# Altium footprint library SMDLibrary.PcbLib: 306 footprints (part 13 of 20)
Each footprint in its own frame and in the unit in brackets; x right, y up, seen from the top. Pads: shape width x height; smd on the part's side, far side on the other; paste and mask are expansions set on the pad; w line width, h text height; cw(c..) or ccw(c..) is an arc to the next point about the centre after c.
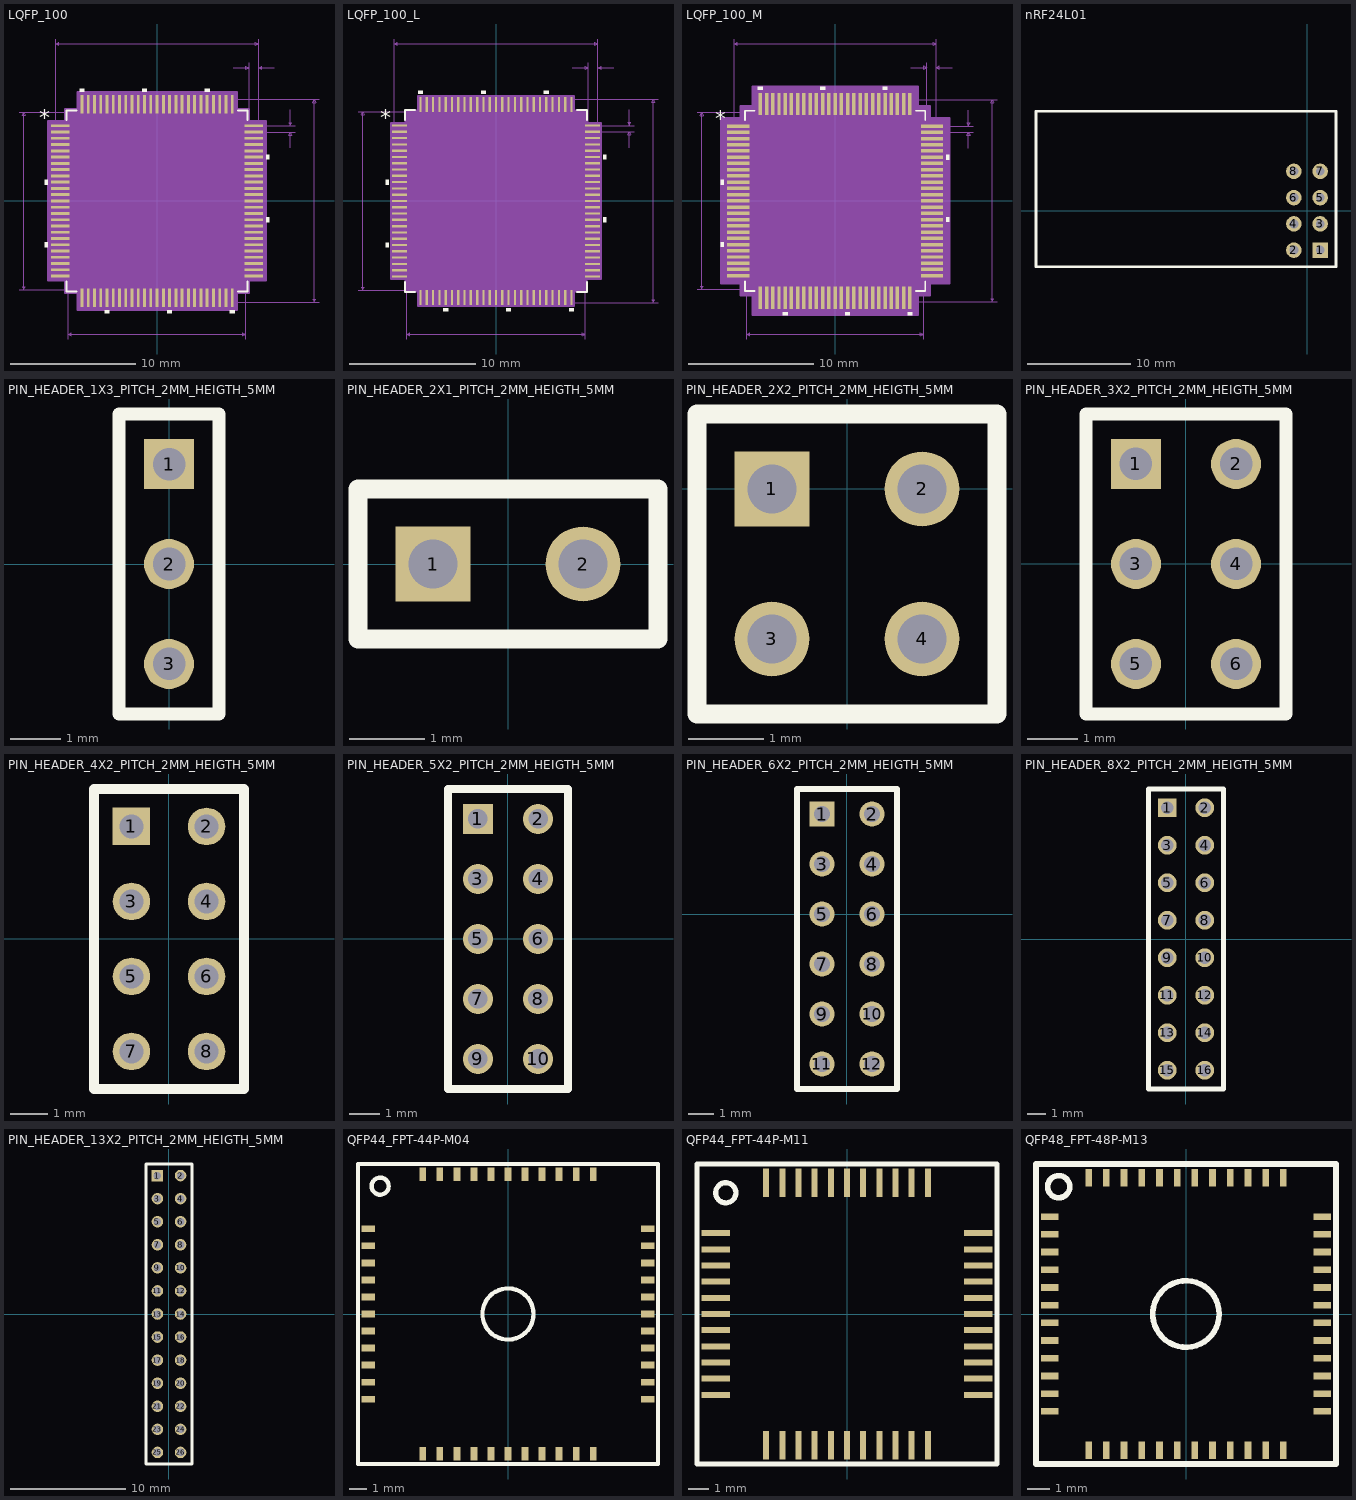
[diagram p12: the footprints below, top view; thin cyan lines are the x and y axes]

## LQFP_100 [mil]
pads (100):
  rect 58x9 smd paste+0 mask+0: 1(-304,236.22) 2(-304,216.54) 3(-304,196.85) 4(-304,177.17) 5(-304,157.48) 6(-304,137.8) 7(-304,118.11) 8(-304,98.43) 9(-304,78.74) 10(-304,59.06) 11(-304,39.37) 12(-304,19.69) 13(-304,0) 14(-304,-19.68) 15(-304,-39.37) 16(-304,-59.06) 17(-304,-78.74) 18(-304,-98.43) 19(-304,-118.11) 20(-304,-137.8) 21(-304,-157.48) 22(-304,-177.17) 23(-304,-196.85) 24(-304,-216.54) 25(-304,-236.22) 51(304,-236.22) 52(304,-216.54) 53(304,-196.85) 54(304,-177.17) 55(304,-157.48) 56(304,-137.8) 57(304,-118.11) 58(304,-98.43) 59(304,-78.74) 60(304,-59.06) 61(304,-39.37) 62(304,-19.68) 63(304,0) 64(304,19.68) 65(304,39.37) 66(304,59.06) 67(304,78.74) 68(304,98.43) 69(304,118.11) 70(304,137.8) 71(304,157.48) 72(304,177.17) 73(304,196.85) 74(304,216.54) 75(304,236.22)
  rect 9x58 smd paste+0 mask+0: 26(-236.22,-304) 27(-216.54,-304) 28(-196.85,-304) 29(-177.17,-304) 30(-157.48,-304) 31(-137.8,-304) 32(-118.11,-304) 33(-98.43,-304) 34(-78.74,-304) 35(-59.06,-304) 36(-39.37,-304) 37(-19.68,-304) 38(0,-304) 39(19.68,-304) 40(39.37,-304) 41(59.06,-304) 42(78.74,-304) 43(98.43,-304) 44(118.11,-304) 45(137.8,-304) 46(157.48,-304) 47(177.17,-304) 48(196.85,-304) 49(216.54,-304) 50(236.22,-304) 76(236.22,304) 77(216.54,304) 78(196.85,304) 79(177.17,304) 80(157.48,304) 81(137.8,304) 82(118.11,304) 83(98.43,304) 84(78.74,304) 85(59.06,304) 86(39.37,304) 87(19.68,304) 88(0,304) 89(-19.68,304) 90(-39.37,304) 91(-59.06,304) 92(-78.74,304) 93(-98.43,304) 94(-118.11,304) 95(-137.8,304) 96(-157.48,304) 97(-177.17,304) 98(-196.85,304) 99(-216.54,304) 100(-236.22,304)
Top Overlay:
  region: -228.72,343 -243.72,343 -243.72,353 -228.72,353
  region: -31.87,343 -46.87,343 -46.87,353 -31.87,353
  region: 164.98,343 149.98,343 149.98,353 164.98,353
  region: 343,145.3 353,145.3 353,130.3 343,130.3
  region: 343,-51.56 353,-51.56 353,-66.56 343,-66.56
  region: 243.72,-343 228.72,-343 228.72,-353 243.72,-353
  region: 46.87,-343 31.87,-343 31.87,-353 46.87,-353
  region: -149.98,-343 -164.98,-343 -164.98,-353 -149.98,-353
  region: -343,-130.3 -353,-130.3 -353,-145.3 -343,-145.3
  region: -343,66.56 -353,66.56 -353,51.56 -343,51.56
  lines w6: -284.5,-253.82 -284.5,-284.5 -253.82,-284.5 ; -284.5,253.82 -284.5,284.5 -253.82,284.5 ; 253.82,-284.5 284.5,-284.5 284.5,-253.82 ; 253.82,284.5 284.5,284.5 284.5,253.82
  text "*" at -370.5,236.06 h50
Mechanical 7:
  lines w1: -434,-279.5 -236.22,-279.5 ; -434,279.5 -236.22,279.5 ; -319,236.22 -319,509 ; -279.5,-434 -279.5,-236.22 ; 236.22,-319 509,-319 ; 236.22,319 509,319 ; 239,419 289,419 ; 279.5,-434 279.5,-236.22 ; 289,236.22 289,434 ; 304,216.54 434,216.54 ; 304,236.22 434,236.22 ; 319,434 319,236.22 319,509 ; 369,419 319,419 ; 419,166.54 419,216.54 ; 419,286.22 419,236.22 ; -419,-279.5 -414,-269.5 -424,-269.5 -419,-279.5 ; -419,-279.5 -419,279.5 ; -419,279.5 -414,269.5 -424,269.5 -419,279.5 ; -319,494 -309,489 -309,499 -319,494 ; -319,494 319,494 ; -279.5,-419 -269.5,-424 -269.5,-414 -279.5,-419 ; -279.5,-419 279.5,-419 ; 279.5,-419 269.5,-424 269.5,-414 279.5,-419 ; 289,419 279,414 279,424 289,419 ; 319,419 329,414 329,424 319,419 ; 319,494 309,489 309,499 319,494 ; 419,216.54 424,206.54 414,206.54 419,216.54 ; 419,236.22 424,246.22 414,246.22 419,236.22 ; 494,-319 499,-309 489,-309 494,-319 ; 494,-319 494,319 ; 494,319 499,309 489,309 494,319
  text "0.638in/16.205mm" at 514,-12.5 h25
  text "0.559in/14.199mm" at -639,-12.5 h25
  text "0.559in/14.199mm" at -100,-464 h25
  text "0.638in/16.205mm" at -100,514 h25
  text "0.03in/0.762mm" at 216.5,439 h25
  text "0.02in/0.5mm" at 439,213.88 h25
  text "Alt 2 Padstyle: OX90Y60D30P" at -337.5,-869 h50
  text "Alt 1 Padstyle: OX60Y90D30P" at -337.5,-809 h50
  text "Default Vert Padstyle: RX9Y58D0T" at -400,-629 h50
  text "Default Horiz Padstyle: RX9Y58D0T" at -412.5,-569 h50
Mechanical 13:
  drawing of 405 lines, arcs and shapes, not listed
  text "*" at -277,221.06 h50
Mechanical 15:
  region: -250.72,-289.5 -289.5,-289.5 -289.5,-250.72 -343,-250.72 -343,250.72 -289.5,250.72 -289.5,289.5 -250.72,289.5 -250.72,343 250.72,343 250.72,289.5 289.5,289.5 289.5,250.72 343,250.72 343,-250.72 289.5,-250.72 289.5,-289.5 250.72,-289.5 250.72,-343 -250.72,-343
  lines w6: -343,-250.72 -343,250.72 -289.5,250.72 -289.5,289.5 -250.72,289.5 -250.72,343 250.72,343 250.72,289.5 289.5,289.5 289.5,250.72 343,250.72 343,-250.72 289.5,-250.72 289.5,-289.5 250.72,-289.5 250.72,-343 -250.72,-343 -250.72,-289.5 -289.5,-289.5 -289.5,-250.72 -343,-250.72
3D body "LQFP-100.step": height 63.11, standoff 0, extent -319.01,-319.01 319.02,319.02
3D body: height 10, standoff 0, extent 0,0 10,10

## LQFP_100_L [mil]
pads (100):
  rect 46x7 smd paste+0 mask+0: 1(-302,236.22) 2(-302,216.54) 3(-302,196.85) 4(-302,177.17) 5(-302,157.48) 6(-302,137.8) 7(-302,118.11) 8(-302,98.43) 9(-302,78.74) 10(-302,59.06) 11(-302,39.37) 12(-302,19.69) 13(-302,0) 14(-302,-19.68) 15(-302,-39.37) 16(-302,-59.06) 17(-302,-78.74) 18(-302,-98.43) 19(-302,-118.11) 20(-302,-137.8) 21(-302,-157.48) 22(-302,-177.17) 23(-302,-196.85) 24(-302,-216.54) 25(-302,-236.22) 51(302,-236.22) 52(302,-216.54) 53(302,-196.85) 54(302,-177.17) 55(302,-157.48) 56(302,-137.8) 57(302,-118.11) 58(302,-98.43) 59(302,-78.74) 60(302,-59.06) 61(302,-39.37) 62(302,-19.68) 63(302,0) 64(302,19.68) 65(302,39.37) 66(302,59.06) 67(302,78.74) 68(302,98.43) 69(302,118.11) 70(302,137.8) 71(302,157.48) 72(302,177.17) 73(302,196.85) 74(302,216.54) 75(302,236.22)
  rect 7x46 smd paste+0 mask+0: 26(-236.22,-302) 27(-216.54,-302) 28(-196.85,-302) 29(-177.17,-302) 30(-157.48,-302) 31(-137.8,-302) 32(-118.11,-302) 33(-98.43,-302) 34(-78.74,-302) 35(-59.06,-302) 36(-39.37,-302) 37(-19.68,-302) 38(0,-302) 39(19.68,-302) 40(39.37,-302) 41(59.06,-302) 42(78.74,-302) 43(98.43,-302) 44(118.11,-302) 45(137.8,-302) 46(157.48,-302) 47(177.17,-302) 48(196.85,-302) 49(216.54,-302) 50(236.22,-302) 76(236.22,302) 77(216.54,302) 78(196.85,302) 79(177.17,302) 80(157.48,302) 81(137.8,302) 82(118.11,302) 83(98.43,302) 84(78.74,302) 85(59.06,302) 86(39.37,302) 87(19.68,302) 88(0,302) 89(-19.68,302) 90(-39.37,302) 91(-59.06,302) 92(-78.74,302) 93(-98.43,302) 94(-118.11,302) 95(-137.8,302) 96(-157.48,302) 97(-177.17,302) 98(-196.85,302) 99(-216.54,302) 100(-236.22,302)
Top Overlay:
  region: -228.72,335 -243.72,335 -243.72,345 -228.72,345
  region: -31.87,335 -46.87,335 -46.87,345 -31.87,345
  region: 164.98,335 149.98,335 149.98,345 164.98,345
  region: 335,145.3 345,145.3 345,130.3 335,130.3
  region: 335,-51.56 345,-51.56 345,-66.56 335,-66.56
  region: 243.72,-335 228.72,-335 228.72,-345 243.72,-345
  region: 46.87,-335 31.87,-335 31.87,-345 46.87,-345
  region: -149.98,-335 -164.98,-335 -164.98,-345 -149.98,-345
  region: -335,-130.3 -345,-130.3 -345,-145.3 -335,-145.3
  region: -335,66.56 -345,66.56 -345,51.56 -335,51.56
  lines w6: -284.5,-252.82 -284.5,-284.5 -252.82,-284.5 ; -284.5,252.82 -284.5,284.5 -252.82,284.5 ; 252.82,-284.5 284.5,-284.5 284.5,-252.82 ; 252.82,284.5 284.5,284.5 284.5,252.82
  text "*" at -362.5,236.06 h50
Mechanical 7:
  lines w1: -432,-279.5 -236.22,-279.5 ; -432,279.5 -236.22,279.5 ; -319,236.22 -319,507 ; -279.5,-432 -279.5,-236.22 ; 236.22,-319 507,-319 ; 236.22,319 507,319 ; 239,417 289,417 ; 279.5,-432 279.5,-236.22 ; 289,236.22 289,432 ; 302,216.54 432,216.54 ; 302,236.22 432,236.22 ; 319,432 319,236.22 319,507 ; 369,417 319,417 ; 417,166.54 417,216.54 ; 417,286.22 417,236.22 ; -417,-279.5 -412,-269.5 -422,-269.5 -417,-279.5 ; -417,-279.5 -417,279.5 ; -417,279.5 -412,269.5 -422,269.5 -417,279.5 ; -319,492 -309,487 -309,497 -319,492 ; -319,492 319,492 ; -279.5,-417 -269.5,-422 -269.5,-412 -279.5,-417 ; -279.5,-417 279.5,-417 ; 279.5,-417 269.5,-422 269.5,-412 279.5,-417 ; 289,417 279,412 279,422 289,417 ; 319,417 329,412 329,422 319,417 ; 319,492 309,487 309,497 319,492 ; 417,216.54 422,206.54 412,206.54 417,216.54 ; 417,236.22 422,246.22 412,246.22 417,236.22 ; 492,-319 497,-309 487,-309 492,-319 ; 492,-319 492,319 ; 492,319 497,309 487,309 492,319
  text "0.638in/16.205mm" at 512,-12.5 h25
  text "0.559in/14.199mm" at -637,-12.5 h25
  text "0.559in/14.199mm" at -100,-462 h25
  text "0.638in/16.205mm" at -100,512 h25
  text "0.03in/0.762mm" at 216.5,437 h25
  text "0.02in/0.5mm" at 437,213.88 h25
  text "Alt 2 Padstyle: OX90Y60D30P" at -337.5,-867 h50
  text "Alt 1 Padstyle: OX60Y90D30P" at -337.5,-807 h50
  text "Default Vert Padstyle: RX7Y46D0T" at -400,-627 h50
  text "Default Horiz Padstyle: RX7Y46D0T" at -412.5,-567 h50
Mechanical 13:
  drawing of 405 lines, arcs and shapes, not listed
  text "*" at -277,221.06 h50
Mechanical 15:
  region: -243.72,-283.5 -283.5,-283.5 -283.5,-243.72 -329,-243.72 -329,243.72 -283.5,243.72 -283.5,283.5 -243.72,283.5 -243.72,329 243.72,329 243.72,283.5 283.5,283.5 283.5,243.72 329,243.72 329,-243.72 283.5,-243.72 283.5,-283.5 243.72,-283.5 243.72,-329 -243.72,-329
  lines w6: -329,-243.72 -329,243.72 -283.5,243.72 -283.5,283.5 -243.72,283.5 -243.72,329 243.72,329 243.72,283.5 283.5,283.5 283.5,243.72 329,243.72 329,-243.72 283.5,-243.72 283.5,-283.5 243.72,-283.5 243.72,-329 -243.72,-329 -243.72,-283.5 -283.5,-283.5 -283.5,-243.72 -329,-243.72
3D body: height 10, standoff 0, extent 0,0 10,10
3D body "LQFP-100-L.step": height 63.11, standoff 0, extent -319.01,-319.01 319.02,319.02

## LQFP_100_M [mil]
pads (100):
  rect 70x11 smd paste+0 mask+0: 1(-306,236.22) 2(-306,216.54) 3(-306,196.85) 4(-306,177.17) 5(-306,157.48) 6(-306,137.8) 7(-306,118.11) 8(-306,98.43) 9(-306,78.74) 10(-306,59.06) 11(-306,39.37) 12(-306,19.69) 13(-306,0) 14(-306,-19.68) 15(-306,-39.37) 16(-306,-59.06) 17(-306,-78.74) 18(-306,-98.43) 19(-306,-118.11) 20(-306,-137.8) 21(-306,-157.48) 22(-306,-177.17) 23(-306,-196.85) 24(-306,-216.54) 25(-306,-236.22) 51(306,-236.22) 52(306,-216.54) 53(306,-196.85) 54(306,-177.17) 55(306,-157.48) 56(306,-137.8) 57(306,-118.11) 58(306,-98.43) 59(306,-78.74) 60(306,-59.06) 61(306,-39.37) 62(306,-19.68) 63(306,0) 64(306,19.68) 65(306,39.37) 66(306,59.06) 67(306,78.74) 68(306,98.43) 69(306,118.11) 70(306,137.8) 71(306,157.48) 72(306,177.17) 73(306,196.85) 74(306,216.54) 75(306,236.22)
  rect 11x70 smd paste+0 mask+0: 26(-236.22,-306) 27(-216.54,-306) 28(-196.85,-306) 29(-177.17,-306) 30(-157.48,-306) 31(-137.8,-306) 32(-118.11,-306) 33(-98.43,-306) 34(-78.74,-306) 35(-59.06,-306) 36(-39.37,-306) 37(-19.68,-306) 38(0,-306) 39(19.68,-306) 40(39.37,-306) 41(59.06,-306) 42(78.74,-306) 43(98.43,-306) 44(118.11,-306) 45(137.8,-306) 46(157.48,-306) 47(177.17,-306) 48(196.85,-306) 49(216.54,-306) 50(236.22,-306) 76(236.22,306) 77(216.54,306) 78(196.85,306) 79(177.17,306) 80(157.48,306) 81(137.8,306) 82(118.11,306) 83(98.43,306) 84(78.74,306) 85(59.06,306) 86(39.37,306) 87(19.68,306) 88(0,306) 89(-19.68,306) 90(-39.37,306) 91(-59.06,306) 92(-78.74,306) 93(-98.43,306) 94(-118.11,306) 95(-137.8,306) 96(-157.48,306) 97(-177.17,306) 98(-196.85,306) 99(-216.54,306) 100(-236.22,306)
Top Overlay:
  region: -351,66.56 -361,66.56 -361,51.56 -351,51.56
  region: -351,-130.3 -361,-130.3 -361,-145.3 -351,-145.3
  region: -149.98,-351 -164.98,-351 -164.98,-361 -149.98,-361
  region: 46.87,-351 31.87,-351 31.87,-361 46.87,-361
  region: 243.72,-351 228.72,-351 228.72,-361 243.72,-361
  region: 351,-51.56 361,-51.56 361,-66.56 351,-66.56
  region: 351,145.3 361,145.3 361,130.3 351,130.3
  region: 164.98,351 149.98,351 149.98,361 164.98,361
  region: -31.87,351 -46.87,351 -46.87,361 -31.87,361
  region: -228.72,351 -243.72,351 -243.72,361 -228.72,361
  lines w6: -284.5,-254.82 -284.5,-284.5 -254.82,-284.5 ; -284.5,254.82 -284.5,284.5 -254.82,284.5 ; 254.82,-284.5 284.5,-284.5 284.5,-254.82 ; 254.82,284.5 284.5,284.5 284.5,254.82
  text "*" at -378.5,236.06 h50
Mechanical 7:
  lines w1: -436,-279.5 -236.22,-279.5 ; -436,279.5 -236.22,279.5 ; -319,236.22 -319,511 ; -279.5,-436 -279.5,-236.22 ; 236.22,-319 511,-319 ; 236.22,319 511,319 ; 239,421 289,421 ; 279.5,-436 279.5,-236.22 ; 289,236.22 289,436 ; 306,216.54 436,216.54 ; 306,236.22 436,236.22 ; 319,436 319,236.22 319,511 ; 369,421 319,421 ; 421,166.54 421,216.54 ; 421,286.22 421,236.22 ; -421,-279.5 -421,279.5 ; -421,-279.5 -426,-269.5 -416,-269.5 -421,-279.5 ; -421,279.5 -426,269.5 -416,269.5 -421,279.5 ; -319,496 319,496 ; -319,496 -309,501 -309,491 -319,496 ; -279.5,-421 279.5,-421 ; -279.5,-421 -269.5,-416 -269.5,-426 -279.5,-421 ; 279.5,-421 269.5,-416 269.5,-426 279.5,-421 ; 289,421 279,426 279,416 289,421 ; 319,421 329,426 329,416 319,421 ; 319,496 309,501 309,491 319,496 ; 421,216.54 416,206.54 426,206.54 421,216.54 ; 421,236.22 416,246.22 426,246.22 421,236.22 ; 496,-319 496,319 ; 496,-319 491,-309 501,-309 496,-319 ; 496,319 491,309 501,309 496,319
  text "Default Horiz Padstyle: RX11Y70D0T" at -425,-571 h50
  text "Default Vert Padstyle: RX11Y70D0T" at -412.5,-631 h50
  text "Alt 1 Padstyle: OX60Y90D30P" at -337.5,-811 h50
  text "Alt 2 Padstyle: OX90Y60D30P" at -337.5,-871 h50
  text "0.02in/0.5mm" at 441,213.88 h25
  text "0.03in/0.762mm" at 216.5,441 h25
  text "0.638in/16.205mm" at -100,516 h25
  text "0.559in/14.199mm" at -100,-466 h25
  text "0.559in/14.199mm" at -641,-12.5 h25
  text "0.638in/16.205mm" at 516,-12.5 h25
Mechanical 13:
  drawing of 405 lines, arcs and shapes, not listed
  text "*" at -277,221.06 h50
Mechanical 15:
  region: -261.72,-299.5 -299.5,-299.5 -299.5,-261.72 -361,-261.72 -361,261.72 -299.5,261.72 -299.5,299.5 -261.72,299.5 -261.72,361 261.72,361 261.72,299.5 299.5,299.5 299.5,261.72 361,261.72 361,-261.72 299.5,-261.72 299.5,-299.5 261.72,-299.5 261.72,-361 -261.72,-361
  lines w6: -361,-261.72 -299.5,-261.72 -299.5,-299.5 -261.72,-299.5 -261.72,-361 261.72,-361 261.72,-299.5 299.5,-299.5 299.5,-261.72 361,-261.72 361,261.72 299.5,261.72 299.5,299.5 261.72,299.5 261.72,361 -261.72,361 -261.72,299.5 -299.5,299.5 -299.5,261.72 -361,261.72 -361,-261.72
3D body "LQFP-100-M.step": height 63.11, standoff 0, extent -319.01,-319.01 319.02,319.02
3D body: height 10, standoff 0, extent 0,0 10,10

## nRF24L01 [mm]
pads (8):
  rect 1.5x1.5 hole 0.85: 1(1.27,-3.81)
  round 1.5 hole 0.85: 2(-1.27,-3.81) 3(1.27,-1.27) 4(-1.27,-1.27) 5(1.27,1.27) 6(-1.27,1.27) 7(1.27,3.81) 8(-1.27,3.81)
Top Overlay:
  lines w0.254: -26.2,-5.4 2.8,-5.4 2.8,9.6 -26.2,9.6 -26.2,-5.4
3D body "User Library-NRF24L01-A.STEP": height 11.02, standoff 6.5, extent -26.2,-5.4 2.8,9.6
3D body "zl201-1_p2-54_l2-54_w2-54_h8-89.stp": height 10.05, standoff -1.89, extent 0,-5.08 2.54,-2.54
3D body "zl201-1_p2-54_l2-54_w2-54_h8-89.stp": height 10.05, standoff -1.89, extent 0,-2.54 2.54,0
3D body "zl201-1_p2-54_l2-54_w2-54_h8-89.stp": height 10.05, standoff -1.89, extent -2.54,-5.08 0,-2.54
3D body "zl201-1_p2-54_l2-54_w2-54_h8-89.stp": height 10.05, standoff -1.89, extent -2.54,-2.539 0,0.001
3D body "zl201-1_p2-54_l2-54_w2-54_h8-89.stp": height 10.05, standoff -1.89, extent 0,0 2.54,2.54
3D body "zl201-1_p2-54_l2-54_w2-54_h8-89.stp": height 10.05, standoff -1.89, extent -2.54,0 0,2.54
3D body "zl201-1_p2-54_l2-54_w2-54_h8-89.stp": height 10.05, standoff -1.89, extent 0,2.54 2.54,5.08
3D body "zl201-1_p2-54_l2-54_w2-54_h8-89.stp": height 10.05, standoff -1.89, extent -2.54,2.54 0,5.08

## PIN_HEADER_1X3_PITCH_2MM_HEIGTH_5MM [mm]
pads (3):
  rect 1x1 hole 0.65: 1(0,2)
  round 1 hole 0.65: 2(0,0) 3(0,-2)
Top Overlay:
  lines w0.254: -1,-3 -1,3 1,3 1,-3 -1,-3
3D body "pin header 1x1 pitch 2mm heigth 5mm.stp": height 6.01, standoff -2.69, extent -1,-3 1,-1
3D body "pin header 1x1 pitch 2mm heigth 5mm.stp": height 6.01, standoff -2.69, extent -1,-1 1,1
3D body "pin header 1x1 pitch 2mm heigth 5mm.stp": height 6.01, standoff -2.69, extent -1,1 1,3

## PIN_HEADER_2X1_PITCH_2MM_HEIGTH_5MM [mm]
pads (2):
  rect 1x1 hole 0.65: 1(-1,0)
  round 1 hole 0.65: 2(1,0)
Top Overlay:
  lines w0.254: -2,-1 -2,1 2,1 2,-1 -2,-1
3D body "pin header 1x1 pitch 2mm heigth 5mm.stp": height 6.01, standoff -2.69, extent -2,-1 0,1
3D body "pin header 1x1 pitch 2mm heigth 5mm.stp": height 6.01, standoff -2.69, extent 0,-1 2,1

## PIN_HEADER_2X2_PITCH_2MM_HEIGTH_5MM [mm]
pads (4):
  rect 1x1 hole 0.65: 1(-1,0)
  round 1 hole 0.65: 2(1,0) 3(-1,-2) 4(1,-2)
Top Overlay:
  lines w0.254: -2,-3 -2,1 2,1 2,-3 -2,-3
3D body "pin header 1x1 pitch 2mm heigth 5mm.stp": height 6.01, standoff -2.69, extent 0,-3 2,-1
3D body "pin header 1x1 pitch 2mm heigth 5mm.stp": height 6.01, standoff -2.69, extent -2,-3 0,-1
3D body "pin header 1x1 pitch 2mm heigth 5mm.stp": height 6.01, standoff -2.69, extent 0,-1 2,1
3D body "pin header 1x1 pitch 2mm heigth 5mm.stp": height 6.01, standoff -2.69, extent -2,-1 0,1

## PIN_HEADER_3X2_PITCH_2MM_HEIGTH_5MM [mm]
pads (6):
  rect 1x1 hole 0.65: 1(-1,2)
  round 1 hole 0.65: 2(1,2) 3(-1,0) 4(1,0) 5(-1,-2) 6(1,-2)
Top Overlay:
  lines w0.254: -2,-3 2,-3 2,3 -2,3 -2,-3
3D body "pin header 1x1 pitch 2mm heigth 5mm.stp": height 6.01, standoff -2.69, extent -2,-3 0,-1
3D body "pin header 1x1 pitch 2mm heigth 5mm.stp": height 6.01, standoff -2.69, extent 0,-3 2,-1
3D body "pin header 1x1 pitch 2mm heigth 5mm.stp": height 6.01, standoff -2.69, extent 0,-1 2,1
3D body "pin header 1x1 pitch 2mm heigth 5mm.stp": height 6.01, standoff -2.69, extent -2,-1 0,1
3D body "pin header 1x1 pitch 2mm heigth 5mm.stp": height 6.01, standoff -2.69, extent 0,1 2,3
3D body "pin header 1x1 pitch 2mm heigth 5mm.stp": height 6.01, standoff -2.69, extent -2,1 0,3

## PIN_HEADER_4X2_PITCH_2MM_HEIGTH_5MM [mm]
pads (8):
  rect 1x1 hole 0.65: 1(-1,3)
  round 1 hole 0.65: 2(1,3) 3(-1,1) 4(1,1) 5(-1,-1) 6(1,-1) 7(-1,-3) 8(1,-3)
Top Overlay:
  lines w0.254: 2,-4 2,-4 ; 2,-4 -2,-4 -2,4 2,4 2,-4
3D body "pin header 1x1 pitch 2mm heigth 5mm.stp": height 6.01, standoff -2.69, extent 0,-4 2,-2
3D body "pin header 1x1 pitch 2mm heigth 5mm.stp": height 6.01, standoff -2.69, extent -2,-4 0,-2
3D body "pin header 1x1 pitch 2mm heigth 5mm.stp": height 6.01, standoff -2.69, extent 0,-2 2,0
3D body "pin header 1x1 pitch 2mm heigth 5mm.stp": height 6.01, standoff -2.69, extent -2,-2 0,0
3D body "pin header 1x1 pitch 2mm heigth 5mm.stp": height 6.01, standoff -2.69, extent 0,0 2,2
3D body "pin header 1x1 pitch 2mm heigth 5mm.stp": height 6.01, standoff -2.69, extent -2,0 0,2
3D body "pin header 1x1 pitch 2mm heigth 5mm.stp": height 6.01, standoff -2.69, extent 0,2 2,4
3D body "pin header 1x1 pitch 2mm heigth 5mm.stp": height 6.01, standoff -2.69, extent -2,2 0,4

## PIN_HEADER_5X2_PITCH_2MM_HEIGTH_5MM [mm]
pads (10):
  rect 1x1 hole 0.65: 1(-1,4)
  round 1 hole 0.65: 2(1,4) 3(-1,2) 4(1,2) 5(-1,0) 6(1,0) 7(-1,-2) 8(1,-2) 9(-1,-4) 10(1,-4)
Top Overlay:
  lines w0.254: -2,-5 -2,5 2,5 2,-5 -2,-5
3D body "pin header 1x1 pitch 2mm heigth 5mm.stp": height 6.01, standoff -2.69, extent 0,-5 2,-3
3D body "pin header 1x1 pitch 2mm heigth 5mm.stp": height 6.01, standoff -2.69, extent 0,-3 2,-1
3D body "pin header 1x1 pitch 2mm heigth 5mm.stp": height 6.01, standoff -2.69, extent 0,-1 2,1
3D body "pin header 1x1 pitch 2mm heigth 5mm.stp": height 6.01, standoff -2.69, extent -2,-5 0,-3
3D body "pin header 1x1 pitch 2mm heigth 5mm.stp": height 6.01, standoff -2.69, extent -2,-3 0,-1
3D body "pin header 1x1 pitch 2mm heigth 5mm.stp": height 6.01, standoff -2.69, extent -2,-1 0,1
3D body "pin header 1x1 pitch 2mm heigth 5mm.stp": height 6.01, standoff -2.69, extent 0,1 2,3
3D body "pin header 1x1 pitch 2mm heigth 5mm.stp": height 6.01, standoff -2.69, extent -2,1 0,3
3D body "pin header 1x1 pitch 2mm heigth 5mm.stp": height 6.01, standoff -2.69, extent 0,3 2,5
3D body "pin header 1x1 pitch 2mm heigth 5mm.stp": height 6.01, standoff -2.69, extent -2,3 0,5

## PIN_HEADER_6X2_PITCH_2MM_HEIGTH_5MM [mm]
pads (12):
  rect 1x1 hole 0.65: 1(-1,4)
  round 1 hole 0.65: 2(1,4) 3(-1,2) 4(1,2) 5(-1,0) 6(1,0) 7(-1,-2) 8(1,-2) 9(-1,-4) 10(1,-4) 11(-1,-6) 12(1,-6)
Top Overlay:
  lines w0.254: -2,-7 2,-7 2,5 ; -2,-7 -2,-7 ; -2,-7 -2,5 2,5 ; 2,5 2,5
3D body "pin header 1x1 pitch 2mm heigth 5mm.stp": height 6.01, standoff -2.69, extent -2,3 0,5
3D body "pin header 1x1 pitch 2mm heigth 5mm.stp": height 6.01, standoff -2.69, extent 0,3 2,5
3D body "pin header 1x1 pitch 2mm heigth 5mm.stp": height 6.01, standoff -2.69, extent -2,1 0,3
3D body "pin header 1x1 pitch 2mm heigth 5mm.stp": height 6.01, standoff -2.69, extent 0,1 2,3
3D body "pin header 1x1 pitch 2mm heigth 5mm.stp": height 6.01, standoff -2.69, extent -2,-1 0,1
3D body "pin header 1x1 pitch 2mm heigth 5mm.stp": height 6.01, standoff -2.69, extent -2,-3 0,-1
3D body "pin header 1x1 pitch 2mm heigth 5mm.stp": height 6.01, standoff -2.69, extent -2,-5 0,-3
3D body "pin header 1x1 pitch 2mm heigth 5mm.stp": height 6.01, standoff -2.69, extent 0,-1 2,1
3D body "pin header 1x1 pitch 2mm heigth 5mm.stp": height 6.01, standoff -2.69, extent 0,-3 2,-1
3D body "pin header 1x1 pitch 2mm heigth 5mm.stp": height 6.01, standoff -2.69, extent 0,-5 2,-3
3D body "pin header 1x1 pitch 2mm heigth 5mm.stp": height 6.01, standoff -2.69, extent 0,-7 2,-5
3D body "pin header 1x1 pitch 2mm heigth 5mm.stp": height 6.01, standoff -2.69, extent -2,-7 0,-5

## PIN_HEADER_8X2_PITCH_2MM_HEIGTH_5MM [mm]
pads (16):
  rect 1x1 hole 0.65: 1(-1,7)
  round 1 hole 0.65: 2(1,7) 3(-1,5) 4(1,5) 5(-1,3) 6(1,3) 7(-1,1) 8(1,1) 9(-1,-1) 10(1,-1) 11(-1,-3) 12(1,-3) 13(-1,-5) 14(1,-5) 15(-1,-7) 16(1,-7)
Top Overlay:
  lines w0.254: 2,8 2,8 ; 2,8 2,-8 -2,-8 -2,8 2,8
3D body "pin header 1x1 pitch 2mm heigth 5mm.stp": height 6.01, standoff -2.69, extent -2,6 0,8
3D body "pin header 1x1 pitch 2mm heigth 5mm.stp": height 6.01, standoff -2.69, extent 0,6 2,8
3D body "pin header 1x1 pitch 2mm heigth 5mm.stp": height 6.01, standoff -2.69, extent -2,4 0,6
3D body "pin header 1x1 pitch 2mm heigth 5mm.stp": height 6.01, standoff -2.69, extent 0,4 2,6
3D body "pin header 1x1 pitch 2mm heigth 5mm.stp": height 6.01, standoff -2.69, extent -2,2 0,4
3D body "pin header 1x1 pitch 2mm heigth 5mm.stp": height 6.01, standoff -2.69, extent -2,0 0,2
3D body "pin header 1x1 pitch 2mm heigth 5mm.stp": height 6.01, standoff -2.69, extent -2,-2 0,0
3D body "pin header 1x1 pitch 2mm heigth 5mm.stp": height 6.01, standoff -2.69, extent 0,2 2,4
3D body "pin header 1x1 pitch 2mm heigth 5mm.stp": height 6.01, standoff -2.69, extent 0,0 2,2
3D body "pin header 1x1 pitch 2mm heigth 5mm.stp": height 6.01, standoff -2.69, extent 0,-2 2,0
3D body "pin header 1x1 pitch 2mm heigth 5mm.stp": height 6.01, standoff -2.69, extent 0,-4 2,-2
3D body "pin header 1x1 pitch 2mm heigth 5mm.stp": height 6.01, standoff -2.69, extent -2,-4 0,-2
3D body "pin header 1x1 pitch 2mm heigth 5mm.stp": height 6.01, standoff -2.69, extent -2,-6 0,-4
3D body "pin header 1x1 pitch 2mm heigth 5mm.stp": height 6.01, standoff -2.69, extent 0,-6 2,-4
3D body "pin header 1x1 pitch 2mm heigth 5mm.stp": height 6.01, standoff -2.69, extent -2,-8 0,-6
3D body "pin header 1x1 pitch 2mm heigth 5mm.stp": height 6.01, standoff -2.69, extent 0,-8 2,-6

## PIN_HEADER_13X2_PITCH_2MM_HEIGTH_5MM [mm]
pads (26):
  rect 1x1 hole 0.65: 1(-1,12)
  round 1 hole 0.65: 2(1,12) 3(-1,10) 4(1,10) 5(-1,8) 6(1,8) 7(-1,6) 8(1,6) 9(-1,4) 10(1,4) 11(-1,2) 12(1,2) 13(-1,0) 14(1,0) 15(-1,-2) 16(1,-2) 17(-1,-4) 18(1,-4) 19(-1,-6) 20(1,-6) 21(-1,-8) 22(1,-8) 23(-1,-10) 24(1,-10) 25(-1,-12) 26(1,-12)
Top Overlay:
  lines w0.254: -2,-13 -2,-13 ; -2,-13 -2,13 2,13 ; -2,-13 2,-13 2,13 ; 2,13 2,13
3D body "pin header 1x1 pitch 2mm heigth 5mm.stp": height 6.01, standoff -2.69, extent -2,-13 0,-11
3D body "pin header 1x1 pitch 2mm heigth 5mm.stp": height 6.01, standoff -2.69, extent 0,-13 2,-11
3D body "pin header 1x1 pitch 2mm heigth 5mm.stp": height 6.01, standoff -2.69, extent -2,-1 0,1
3D body "pin header 1x1 pitch 2mm heigth 5mm.stp": height 6.01, standoff -2.69, extent 0,-1 2,1
3D body "pin header 1x1 pitch 2mm heigth 5mm.stp": height 6.01, standoff -2.69, extent -2,-3 0,-1
3D body "pin header 1x1 pitch 2mm heigth 5mm.stp": height 6.01, standoff -2.69, extent 0,-3 2,-1
3D body "pin header 1x1 pitch 2mm heigth 5mm.stp": height 6.01, standoff -2.69, extent -2,-5 0,-3
3D body "pin header 1x1 pitch 2mm heigth 5mm.stp": height 6.01, standoff -2.69, extent -2,-7 0,-5
3D body "pin header 1x1 pitch 2mm heigth 5mm.stp": height 6.01, standoff -2.69, extent -2,-9 0,-7
3D body "pin header 1x1 pitch 2mm heigth 5mm.stp": height 6.01, standoff -2.69, extent 0,-5 2,-3
3D body "pin header 1x1 pitch 2mm heigth 5mm.stp": height 6.01, standoff -2.69, extent 0,-7 2,-5
3D body "pin header 1x1 pitch 2mm heigth 5mm.stp": height 6.01, standoff -2.69, extent 0,-9 2,-7
3D body "pin header 1x1 pitch 2mm heigth 5mm.stp": height 6.01, standoff -2.69, extent 0,-11 2,-9
3D body "pin header 1x1 pitch 2mm heigth 5mm.stp": height 6.01, standoff -2.69, extent -2,-11 0,-9
3D body "pin header 1x1 pitch 2mm heigth 5mm.stp": height 6.01, standoff -2.69, extent -2,1 0,3
3D body "pin header 1x1 pitch 2mm heigth 5mm.stp": height 6.01, standoff -2.69, extent 0,1 2,3
3D body "pin header 1x1 pitch 2mm heigth 5mm.stp": height 6.01, standoff -2.69, extent 0,3 2,5
3D body "pin header 1x1 pitch 2mm heigth 5mm.stp": height 6.01, standoff -2.69, extent 0,5 2,7
3D body "pin header 1x1 pitch 2mm heigth 5mm.stp": height 6.01, standoff -2.69, extent 0,7 2,9
3D body "pin header 1x1 pitch 2mm heigth 5mm.stp": height 6.01, standoff -2.69, extent -2,3 0,5
3D body "pin header 1x1 pitch 2mm heigth 5mm.stp": height 6.01, standoff -2.69, extent -2,5 0,7
3D body "pin header 1x1 pitch 2mm heigth 5mm.stp": height 6.01, standoff -2.69, extent -2,7 0,9
3D body "pin header 1x1 pitch 2mm heigth 5mm.stp": height 6.01, standoff -2.69, extent 0,9 2,11
3D body "pin header 1x1 pitch 2mm heigth 5mm.stp": height 6.01, standoff -2.69, extent -2,9 0,11
3D body "pin header 1x1 pitch 2mm heigth 5mm.stp": height 6.01, standoff -2.69, extent 0,11 2,13
3D body "pin header 1x1 pitch 2mm heigth 5mm.stp": height 6.01, standoff -2.69, extent -2,11 0,13

## QFP44_FPT-44P-M04 [mm]
pads (44):
  rect 0.8x0.4 smd: 1(-8.2,5) 2(-8.2,4) 3(-8.2,3) 4(-8.2,2) 5(-8.2,1) 6(-8.2,0) 7(-8.2,-1) 8(-8.2,-2) 9(-8.2,-3) 10(-8.2,-4) 11(-8.2,-5) 23(8.2,5) 24(8.2,4) 25(8.2,3) 26(8.2,2) 27(8.2,1) 28(8.2,0) 29(8.2,-1) 30(8.2,-2) 31(8.2,-3) 32(8.2,-4) 33(8.2,-5)
  rect 0.4x0.8 smd: 12(-5,-8.2) 13(-4,-8.2) 14(-3,-8.2) 15(-2,-8.2) 16(-1,-8.2) 17(0,-8.2) 18(1,-8.2) 19(2,-8.2) 20(3,-8.2) 21(4,-8.2) 22(5,-8.2) 34(5,8.2) 35(4,8.2) 36(3,8.2) 37(2,8.2) 38(1,8.2) 39(0,8.2) 40(-1,8.2) 41(-2,8.2) 42(-3,8.2) 43(-4,8.2) 44(-5,8.2)
Top Overlay:
  circle w0.254: c0,0 r1.5
  circle w0.254: c-7.5,7.5 r0.5
  lines w0.254: -8.8,-8.8 -8.8,8.8 8.8,8.8 8.8,-8.8 -8.8,-8.8
3D body "QFP44_FPT-44P-M04.stp": height 3.3, standoff 0, extent -8.6,-8.6 8.6,8.6

## QFP44_FPT-44P-M11 [mm]
pads (44):
  rect 1.4x0.3 smd: 1(-6.5,4) 2(-6.5,3.2) 3(-6.5,2.4) 4(-6.5,1.6) 5(-6.5,0.8) 6(-6.5,0) 7(-6.5,-0.8) 8(-6.5,-1.6) 9(-6.5,-2.4) 10(-6.5,-3.2) 11(-6.5,-4) 23(6.5,-4) 24(6.5,-3.2) 25(6.5,-2.4) 26(6.5,-1.6) 27(6.5,-0.8) 28(6.5,0) 29(6.5,0.8) 30(6.5,1.6) 31(6.5,2.4) 32(6.5,3.2) 33(6.5,4)
  rect 0.3x1.4 smd: 12(-4,-6.5) 13(-3.2,-6.5) 14(-2.4,-6.5) 15(-1.6,-6.5) 16(-0.8,-6.5) 17(0,-6.5) 18(0.8,-6.5) 19(1.6,-6.5) 20(2.4,-6.5) 21(3.2,-6.5) 22(4,-6.5) 34(4,6.5) 35(3.2,6.5) 36(2.4,6.5) 37(1.6,6.5) 38(0.8,6.5) 39(0,6.5) 40(-0.8,6.5) 41(-1.6,6.5) 42(-2.4,6.5) 43(-3.2,6.5) 44(-4,6.5)
Top Overlay:
  circle w0.254: c-6,6 r0.5
  lines w0.254: -7.425,-7.425 -7.425,7.425 7.425,7.425 7.425,-7.425 -7.425,-7.425
3D body "QFP44_FPT-44P-M11.stp": height 2.3, standoff 0, extent -7.2,-7.2 7.2,7.2

## QFP48_FPT-48P-M13 [mm]
pads (48):
  rect 0.8x0.3 smd: 1(-6.15,4.4) 2(-6.15,3.6) 3(-6.15,2.8) 4(-6.15,2) 5(-6.15,1.2) 6(-6.15,0.4) 7(-6.15,-0.4) 8(-6.15,-1.2) 9(-6.15,-2) 10(-6.15,-2.8) 11(-6.15,-3.6) 12(-6.15,-4.4) 25(6.15,-4.4) 26(6.15,-3.6) 27(6.15,-2.8) 28(6.15,-2) 29(6.15,-1.2) 30(6.15,-0.4) 31(6.15,0.4) 32(6.15,1.2) 33(6.15,2) 34(6.15,2.8) 35(6.15,3.6) 36(6.15,4.4)
  rect 0.3x0.8 smd: 13(-4.4,-6.15) 14(-3.6,-6.15) 15(-2.8,-6.15) 16(-2,-6.15) 17(-1.2,-6.15) 18(-0.4,-6.15) 19(0.4,-6.15) 20(1.2,-6.15) 21(2,-6.15) 22(2.8,-6.15) 23(3.6,-6.15) 24(4.4,-6.15) 37(4.4,6.15) 38(3.6,6.15) 39(2.8,6.15) 40(2,6.15) 41(1.2,6.15) 42(0.4,6.15) 43(-0.4,6.15) 44(-1.2,6.15) 45(-2,6.15) 46(-2.8,6.15) 47(-3.6,6.15) 48(-4.4,6.15)
Top Overlay:
  circle w0.254: c-5.75,5.75 r0.5
  circle w0.254: c0,0 r1.5
  lines w0.254: -6.775,-6.775 -6.775,6.775 6.775,6.775 6.775,-6.775 -6.775,-6.775
3D body "QFP48_FPT-48P-M13.stp": height 2.3, standoff 0, extent -6.55,-6.55 6.55,6.55